# Altium footprint library c3_PcbLib.PcbLib: 222 footprints (part 14 of 14)
Each footprint in its own frame and in the unit in brackets; x right, y up, seen from the top. Pads: shape width x height; smd on the part's side, far side on the other; paste and mask are expansions set on the pad; w line width, h text height; cw(c..) or ccw(c..) is an arc to the next point about the centre after c.
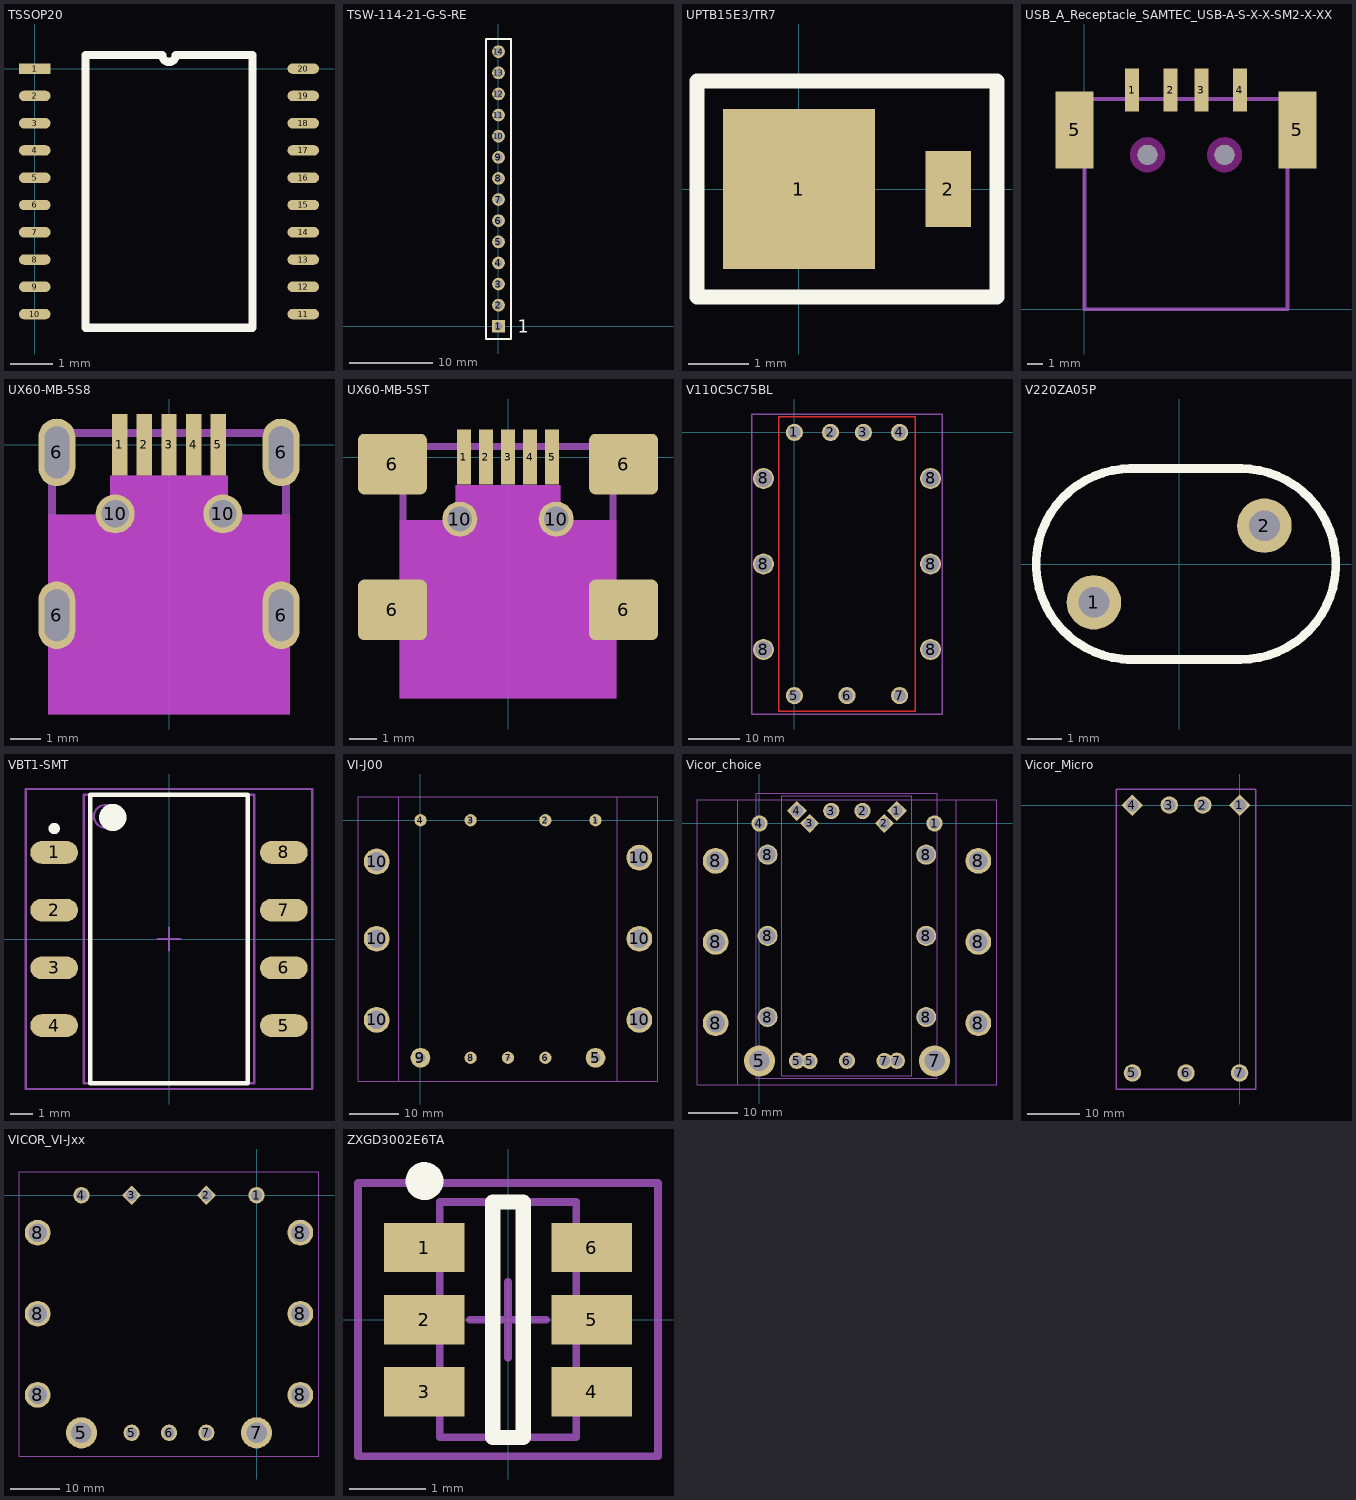
[diagram p13: the footprints below, top view; thin cyan lines are the x and y axes]

## TSSOP20 [mm]
pads (20):
  rect 0.75x0.25 smd: 1(0,0)
  oval 0.75x0.25 smd: 2(0,-0.65) 3(0,-1.3) 4(0,-1.95) 5(0,-2.6) 6(0,-3.25) 7(0,-3.9) 8(0,-4.55) 9(0,-5.2) 10(0,-5.85) 11(6.4,-5.85) 12(6.4,-5.2) 13(6.4,-4.55) 14(6.4,-3.9) 15(6.4,-3.25) 16(6.4,-2.6) 17(6.4,-1.95) 18(6.4,-1.3) 19(6.4,-0.65) 20(6.4,0)
Top Overlay:
  lines w0.2: 1.21,-6.175 1.21,0.325 3.037,0.325 ccw(c3.2,0.325) 3.362,0.325 5.19,0.325 5.19,-6.175 1.21,-6.175

## TSW-114-21-G-S-RE [mil]
pads (14):
  rect 60x60 hole 39: 1(0,0)
  round 60 hole 39: 2(0,100) 3(0,200) 4(0,300) 5(0,400) 6(0,500) 7(0,600) 8(0,700) 9(0,800) 10(0,900) 11(0,1000) 12(0,1100) 13(0,1200) 14(0,1300)
Top Overlay:
  lines w10: -60,-60 60,-60 60,1360 -60,1360 -60,-60
  text "1" at 90,-30 h60

## UPTB15E3/TR7 [mil]
pads (2):
  rect 100x105 smd: 1(0,0)
  rect 30x50 smd: 2(98,0)
Top Overlay:
  lines w10: -66.93,-70.87 129.92,-70.87 129.92,70.87 -66.93,70.87 -66.93,-70.87
3D body: height 6, standoff 0, extent 48,-10.49 104,10.51
3D body: height 6, standoff 0, extent -43.5,-16.99 -26.5,17.01
3D body: height 40, standoff 0, extent -26.5,-37.5 48.5,37.5

## USB_A_Receptacle_SAMTEC_USB-A-S-X-X-SM2-X-XX [mil]
pads (8):
  rect 35x110 smd: 1(122,560.1) 2(220.5,560.1) 3(299.5,560.1) 4(398,560.1)
  rect 98x197 smd: 5(-25,458.5) 5(545,458.5)
  round 51 hole 51 unplated: ""(161.5,395) ""(358.5,395)
Keep-Out Layer:
  circle w30: c161.5,395 r30
  circle w30: c358.5,395 r30
Mechanical 13:
  lines w5: 0,395 -63,395 -63,538 0,538 ; 109,538 109,590 135,590 135,538 ; 520,395 583,395 583,538 520,538 ; 207,538 233,538 233,590 207,590 207,538 ; 286,538 312,538 312,590 286,590 286,538 ; 384,538 384,590 410,590 410,538 384,538
  lines w10: 109,538 135,538 ; 0,0 520,0 520,538 0,538 0,0
3D body: height 272, standoff 0, extent 0.02,-0.98 519.98,537.98
3D body: height 10, standoff 0, extent -62.98,395.02 -0.02,537.98
3D body: height 10, standoff 0, extent 109.02,538.02 134.98,589.98
3D body: height 10, standoff 0, extent 109.02,538.02 134.98,589.98
3D body: height 10, standoff 0, extent 207.02,538.02 232.98,589.98
3D body: height 10, standoff 0, extent 286.02,538.02 311.98,589.98
3D body: height 10, standoff 0, extent 520.02,395.02 582.98,537.98
3D body: height 10, standoff 0, extent 384.02,538.02 409.98,589.98

## UX60-MB-5S8 [mm]
pads (11):
  rect 0.5x2 smd: 1(-1.6,0) 2(-0.8,0) 3(0,0) 4(0.8,0) 5(1.6,0)
  oval 1.2x2.2 hole 0.8 slot 1.7 at 90 deg: 6(-3.65,-5.55) 6(-3.65,-0.25) 6(3.65,-5.55) 6(3.65,-0.25)
  round 1.27 hole 0.9: 10(-1.75,-2.25) 10(1.75,-2.25)
Mechanical 13:
  lines w0.254: -3.81,-8.636 3.81,-8.636 3.81,0.381 -3.81,0.381 -3.81,-8.636
Mechanical 15 keep-out:
  region: -1.905,-1.016 1.905,-1.016 1.905,-2.286 3.937,-2.286 3.937,-8.763 -3.937,-8.763 -3.937,-2.286 -1.905,-2.286
3D body: height 4, standoff 0, extent -3.809,-8.635 3.809,0.38

## UX60-MB-5ST [mm]
pads (11):
  rect 0.5x2 smd: 1(-1.6,0) 2(-0.8,0) 3(0,0) 4(0.8,0) 5(1.6,0)
  rrect20% 2.5x2.2 smd: 6(-4.2,-5.55) 6(-4.2,-0.25) 6(4.2,-5.55) 6(4.2,-0.25)
  round 1.27 hole 0.9: 10(-1.75,-2.25) 10(1.75,-2.25)
Mechanical 13:
  lines w0.254: -3.81,-8.636 -3.81,0.381 3.81,0.381 3.81,-8.636 -3.81,-8.636
Mechanical 15 keep-out:
  region: -1.905,-1.016 1.905,-1.016 1.905,-2.286 3.937,-2.286 3.937,-8.763 -3.937,-8.763 -3.937,-2.286 -1.905,-2.286
3D body: height 4.12, standoff -0.97, extent -4.947,-8.537 4.953,0.663

## V110C5C75BL [mil] "V110C5C75BL"
pads (13):
  round 130 hole 94: 1(0,0) 2(275,0) 3(525,0) 4(800,0) 5(0,-2000) 6(400,-2000) 7(800,-2000)
  round 160 hole 128.5: 8(-235,-1650) 8(-235,-1000) 8(-235,-350) 8(1035,-1650) 8(1035,-1000) 8(1035,-350)
Top Layer:
  lines w10: -120,-2120 -120,120 920,120 920,-2120 -120,-2120
Mechanical 13:
  lines w10: -325,-2140 1125,-2140 1125,140 -325,140 -325,-2140
3D body: height 330, standoff 0, extent -119.98,-2119.98 919.98,119.98
3D body: height 530, standoff 330, extent -324.98,-2139.98 1124.98,139.98

## V220ZA05P [mm]
pads (2):
  round 1.6 hole 0.9: 1(-2.5,-1.125) 2(2.5,1.125)
Top Overlay:
  lines w0.254: -1.524,-2.8 1.803,-2.8 ; -1.448,2.8 1.829,2.8 ; -1.4,-2.8 cw(c-1.4,0) -1.4,2.8 ; 1.8,-2.8 ccw(c1.8,0) 1.8,2.8

## VBT1-SMT [mm] "SOP, 8-Leads, Body 12.7x7.5mm (max), Pitch 2.54mm, IPC Medium Density"
height 6
pads (8):
  oval 2.1x1 smd: 1(-5.05,3.81) 2(-5.05,1.27) 3(-5.05,-1.27) 4(-5.05,-3.81) 5(5.05,-3.81) 6(5.05,-1.27) 7(5.05,1.27) 8(5.05,3.81)
Top Overlay:
  circle w0.6: c-2.475,5.35 r0.3
  circle w0.25: c-5.05,4.86 r0.125
  lines w0.2: -3.475,-6.35 3.475,-6.35 3.475,6.35 -3.475,6.35 -3.475,-6.35
Mechanical 13:
  circle w0.1: c-2.8,5.4 r0.5
  lines w0.1: -3.75,-6.35 3.75,-6.35 3.75,6.35 -3.75,6.35 -3.75,-6.35
Mechanical 15:
  lines w0.1: -0.5,0 0.5,0 ; 0,-0.5 0,0.5 ; -6.3,-6.6 6.3,-6.6 6.3,6.6 -6.3,6.6 -6.3,-6.6
3D body: height 6, standoff 0.25, extent -3.75,-6.35 3.75,6.35

## VI-J00 [mm] "VI-J00 110 to 5"
pads (15):
  round 2.5 hole 1: 1(35.6,0) 2(25.4,0) 3(10.2,0) 4(0,0) 6(25.4,-48.3) 7(17.8,-48.3) 8(10.2,-48.3)
  round 4 hole 2: 5(35.6,-48.3) 9(0,-48.3)
  round 5.25 hole 3.8: 10(-8.9,-40.6) 10(-8.9,-24.1) 10(-8.9,-8.4) 10(44.5,-40.6) 10(44.5,-24.1) 10(44.5,-7.6)
Mechanical 1:
  lines w0.254: -4.4,-53.1 -4.4,4.8 40,4.8 40,-53.1 -4.4,-53.1
Mechanical 13:
  lines w0.254: -12.7,-53.1 -12.7,4.8 48.3,4.8 48.3,-53.1 -12.7,-53.1
3D body: height 9.7, standoff 0, extent -4.399,-53.099 39.999,4.799
3D body: height 12.7, standoff 9.7, extent -12.699,-53.099 48.299,4.799

## Vicor_choice [mil]
pads (27):
  rect 115x115 hole 94 rot 45: 1(1100,100) 4(300,100)
  round 130 hole 90: 1(1401.57,0) 4(0,0) 5(300,-1900) 5(401.57,-1901.57) 6(700,-1900) 7(1000,-1901.57) 7(1100,-1900)
  round 130 hole 94: 2(825,100) 3(575,100)
  rect 110x110 hole 90 rot 45: 2(1000,0) 3(401.57,0)
  round 250 hole 164: 5(0,-1901.57) 7(1401.57,-1901.57)
  round 206.69 hole 149.61: 8(-350.39,-1598.43) 8(-350.39,-948.82) 8(-350.39,-300) 8(1751.97,-1598.43) 8(1751.97,-948.82) 8(1751.97,-299.21)
  round 160 hole 128.5: 8(65,-1550) 8(65,-900) 8(65,-250) 8(1335,-1550) 8(1335,-900) 8(1335,-250)
Mechanical 1:
  lines w10: -173.23,-2090.55 1574.8,-2090.55 1574.8,188.98 -173.23,188.98 -173.23,-2090.55
Mechanical 13:
  lines w10: -500,-2090.55 1901.57,-2090.55 1901.57,188.98 -500,188.98 -500,-2090.55 ; -25,-2040 -25,240 1425,240 1425,-2040 -25,-2040 ; 180,-2020 180,220 1220,220 1220,-2020 180,-2020

## Vicor_Micro [mil]
pads (7):
  rect 115x115 hole 94 rot 45: 1(0,0) 4(-800,0)
  round 130 hole 94: 2(-275,0) 3(-525,0)
  round 130 hole 90: 5(-800,-2000) 6(-400,-2000) 7(0,-2000)
Mechanical 13:
  lines w10: -920,-2120 120,-2120 120,120 -920,120 -920,-2120
3D body: height 551.18, standoff -43.31, extent -1115.35,-2143.9 334.65,136.02

## VICOR_VI-Jxx [mm]
pads (15):
  round 3.302 hole 2.286: 1(0,0) 4(-35.6,0) 5(-25.4,-48.3) 6(-17.78,-48.3) 7(-10.2,-48.3)
  rect 2.794x2.794 hole 2.286 rot 45: 2(-10.2,0) 3(-25.4,0)
  round 6.35 hole 4.166: 5(-35.6,-48.3) 7(0,-48.3)
  round 5.25 hole 3.8: 8(-44.5,-40.6) 8(-44.5,-24.1) 8(-44.5,-7.62) 8(8.9,-40.6) 8(8.9,-24.1) 8(8.9,-7.6)
Mechanical 13:
  lines w0.254: -48.3,-53.1 12.7,-53.1 12.7,4.8 -48.3,4.8 -48.3,-53.1
3D body: height 6.05, standoff -13.76, extent -48.241,-53.076 12.719,4.836

## ZXGD3002E6TA [mm] "SOT23, 6-Leads, Body 3.1x3.2mm (max), Pitch 0.95mm, IPC Medium Density"
height 1.45
pads (6):
  rect 1.06x0.65 smd: 1(-1.1,0.95) 2(-1.1,0) 3(-1.1,-0.95) 4(1.1,-0.95) 5(1.1,0) 6(1.1,0.95)
Top Overlay:
  circle w0.25: c-1.1,1.825 r0.125
  lines w0.2: -0.2,-1.55 -0.2,1.55 0.2,1.55 0.2,-1.55 -0.2,-1.55
Mechanical 13:
  lines w0.1: -0.9,-1.55 0.9,-1.55 0.9,1.55 -0.9,1.55 -0.9,-1.55
Mechanical 15:
  lines w0.1: -0.5,0 0.5,0 ; 0,-0.5 0,0.5 ; -1.975,-1.8 1.975,-1.8 1.975,1.8 -1.975,1.8 -1.975,-1.8
3D body: height 1.45, standoff 0, extent -0.9,-1.55 0.9,1.55